# Altium footprint library LUMI_Standard_Auto_Soldering_LIB.PcbLib: 344 footprints (part 4 of 22)
Each footprint in its own frame and in the unit in brackets; x right, y up, seen from the top. Pads: shape width x height; smd on the part's side, far side on the other; paste and mask are expansions set on the pad; w line width, h text height; cw(c..) or ccw(c..) is an arc to the next point about the centre after c.
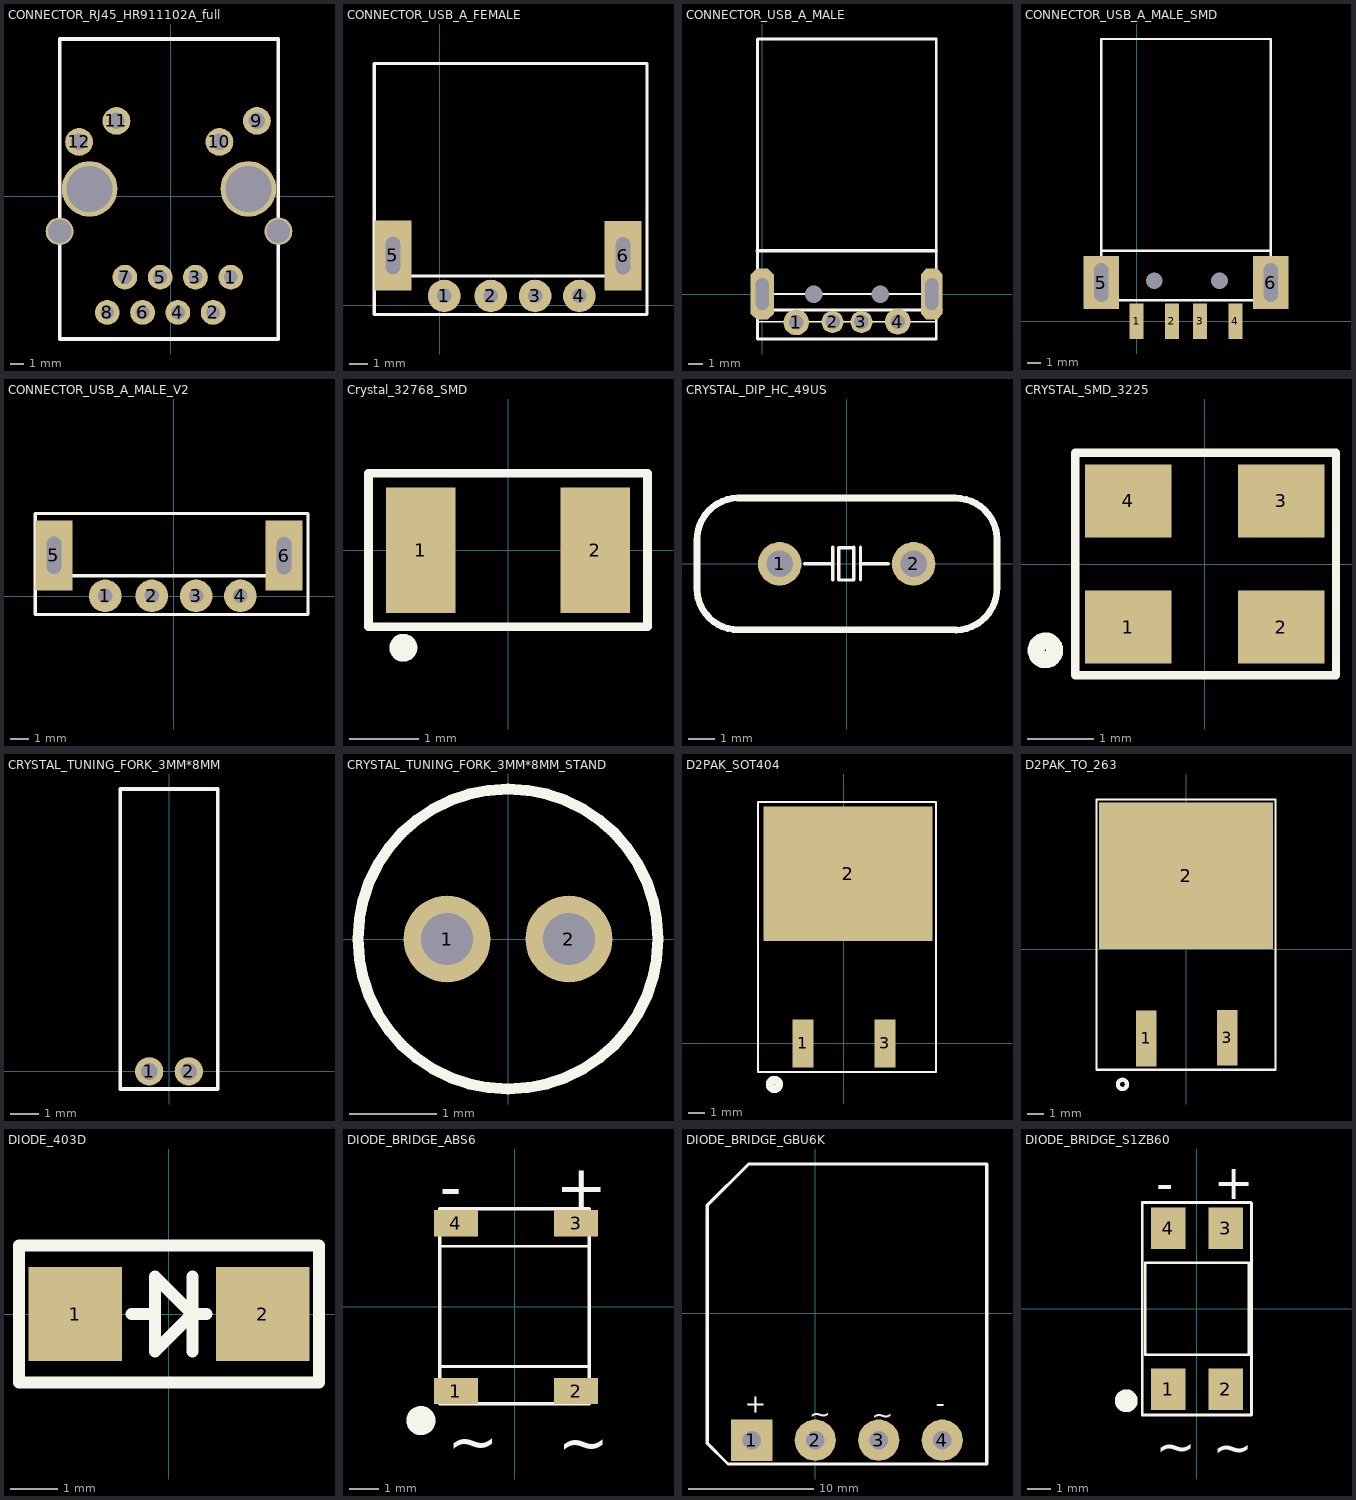
[diagram p3: the footprints below, top view; thin cyan lines are the x and y axes]

## CONNECTOR_RJ45_HR911102A_full [mm] "Single Port RJ45 Connector with Integrated Magnetics and LED"
pads (16):
  round 1.778 hole 1: 1(4.317,-5.837) 2(3.047,-8.377) 3(1.777,-5.837) 4(0.507,-8.377) 5(-0.763,-5.837) 6(-2.033,-8.377) 7(-3.303,-5.837) 8(-4.573,-8.377)
  round 2 hole 1.2: 9(6.197,5.413) 10(3.5,3.9) 11(-3.913,5.413) 12(-6.6,3.9)
  round 2 hole 1.7: ""(-8.003,-2.537) ""(7.747,-2.537)
  round 4 hole 3.3: ""(-5.843,0.513) ""(5.587,0.513)
Top Overlay:
  lines w0.254: -8.003,-10.287 7.747,-10.287 7.747,11.303 -8.003,11.303 -8.003,-10.287
3D body: height 13.42, standoff -3.38, extent -8.3,-10 7.7,11.3

## CONNECTOR_USB_A_FEMALE [mil] "USB A connector, 4pin, For USB sing"
height 100
pads (6):
  round 70 hole 31: 1(10,20) 2(110,20) 3(205,20) 4(300,20)
  rect 80x150 hole 31 slot 80 at 90 deg: 5(-100,107) 6(393.7,106.3)
Top Overlay:
  lines w7: -103,63 396,63 ; -140,-20 445,-20 445,519 -140,519 -140,-20
3D body: height 273.62, standoff -165.35, extent -163.02,-19 459.02,520.37

## CONNECTOR_USB_A_MALE [mm] "USB A connector, 4pin, For USB sing"
height 2.54
pads (8):
  round 1.778 hole 1: 1(2.35,-1.95) 4(9.35,-1.9)
  round 1.524 hole 1: 2(4.85,-1.925) 3(6.85,-1.925)
  oct 1.6x3.5 hole 0.9 slot 2.2 at 90 deg: ""(0,0)
  round 0 hole 1.2: ""(3.55,0) ""(8.15,0)
  oct 1.5x3.5 hole 0.9 slot 2.2 at 90 deg: ""(11.7,0)
Top Overlay:
  lines w0.1: -0.325,-1.9 12,-1.9
  lines w0.127: 0,0 11.7,0
  lines w0.178: -0.316,-1.1 12.358,-1.1 ; -0.325,-3.1 -0.325,17.6 12,17.6 12,-3.1 -0.325,-3.1
  lines w0.254: -0.325,3 12,3
3D body: height 3.52, standoff -2.18, extent -0.4,-2.3 12.1,17.73

## CONNECTOR_USB_A_MALE_SMD [mil] "For USB SMD"
height 150
pads (8):
  rect 40x100 smd: 1(0,0) 2(100,0) 3(180,0) 4(280,0)
  round 0 hole 47.24: 2(50,115) 2(235,115)
  rect 100x150 hole 40 slot 110 at 90 deg: 5(-100,110) 6(380,110)
Top Overlay:
  lines w7: -100,200 380,200 ; -100,60 380,60 380,800 -100,800 -100,60
3D body: height 85.83, standoff -138.58, extent -105.32,-5.91 386.81,809.05

## CONNECTOR_USB_A_MALE_V2 [mil]
pads (6):
  round 70 hole 31: 1(-147.48,0.32) 2(-47.48,0.32) 3(47.52,0.32) 4(142.52,0.32)
  rect 80x150 hole 31 slot 80 at 90 deg: 5(-257.48,87.31) 6(236.22,86.61)
Top Overlay:
  lines w7: -260.48,43.31 238.52,43.31 ; -297.48,-39.69 287.52,-39.69 287.52,177.17 -297.48,177.17 -297.48,-39.69
3D body: height 273.62, standoff -165.35, extent -320.5,-38.69 301.54,500.68

## Crystal_32768_SMD [mm]
pads (2):
  rect 1x1.8 smd: 1(-1.25,0) 2(1.25,0)
Top Overlay:
  circle w0.2: c-1.5,-1.4 r0.1
  lines w0.127: -2,-1.1 2,-1.1 2,1.1 -2,1.1 -2,-1.1
3D body: height 0.8, standoff 0, extent -1.6,-0.75 1.6,0.75

## CRYSTAL_DIP_HC_49US [mil]
pads (2):
  round 65 hole 40: 1(-100,0) 2(100,0)
Top Overlay:
  lines w5: -223.43,-37.4 -222.44,-37.4 ; -62.99,0 -21.65,0 ; -20.67,-23.62 -20.67,24.61 ; 10.33,-24.11 -11.81,-24.11 -11.81,24.11 10.33,24.11 ; 10.83,-23.62 10.83,24.61 ; 20.67,-23.62 20.67,24.61 ; 20.67,0 62.01,0 ; 223.43,36.91 224.41,36.91
  lines w10: 162.4,97.93 cw(c162.89,36.42) 224.41,36.91 224.41,-34.94 cw(c161.91,-36.42) 163.39,-98.92 ; 162.4,98.43 -162.4,98.43 ccw(c-160.93,35.93) -223.43,34.45 -223.43,-37.4 ccw(c-161.91,-36.91) -161.42,-98.43 163.39,-98.43
3D body: height 145.67, standoff -149.61, extent -223.43,-93.07 223.43,90

## CRYSTAL_SMD_3225 [mm]
pads (4):
  rect 1.3x1.1 smd: 1(-1.15,-0.95) 2(1.15,-0.95) 3(1.15,0.95) 4(-1.15,0.95)
Top Overlay:
  circle w0.254: c-2.4,-1.3 r0.141
  lines w0.127: -1.95,-1.675 -1.95,1.4 -1.95,1.675 1.575,1.675 1.975,1.675 1.975,-1.675 -1.95,-1.675
3D body: height 0.81, standoff 0, extent -1.6,-1.25 1.6,1.25

## CRYSTAL_TUNING_FORK_3MM*8MM [mm]
pads (2):
  round 1 hole 0.6 mask+0.07: 1(-0.7,0) 2(0.7,0)
Top Overlay:
  lines w0.127: -1.725,-0.625 -1.725,10 1.725,10 1.725,-0.625 -1.725,-0.625
3D body: height 3.1, standoff -0.1, extent -1.725,-0.812 1.725,9.963

## CRYSTAL_TUNING_FORK_3MM*8MM_STAND [mm]
pads (2):
  round 1 hole 0.6 mask+0.07: 1(-0.7,0) 2(0.7,0)
Top Overlay:
  circle w0.127: c0,0 r1.725
3D body: height 8.27, standoff -2.5, extent -1.725,-1.6 1.725,1.6

## D2PAK_SOT404 [mm]
pads (3):
  rect 1.3x3 smd: 1(-2.54,0) 3(2.54,0)
  rect 10.5x8.35 smd: 2(0.254,10.541)
Top Overlay:
  circle w0.5: c-4.318,-2.54 r0.284
  lines w0.127: -5.334,-1.778 0,-1.778 5.715,-1.778 5.715,14.986 -5.334,14.986 -5.334,-1.778
3D body: height 4.83, standoff 0, extent -5.16,-1.144 5.51,14.736

## D2PAK_TO_263 [mm]
pads (3):
  rect 1.26x3.43 smd: 1(-2.45,-5.475) 3(2.54,-5.44)
  rect 10.67x9 smd: 2(0,4.5)
Top Overlay:
  circle w0.254: c-3.9,-8.3 r0.283
  lines w0.127: -5.5,-7.4 -5.5,9.2 4.7,9.2 5.5,9.2 5.5,-7.4 5.3,-7.4 -5.2,-7.4 -5.5,-7.4
3D body: height 5.03, standoff 0.02, extent -5.08,-7.133 5.08,8.131

## DIODE_403D [mm]
pads (2):
  rect 2x2 smd: 1(-2,0) 2(2,0)
Top Overlay:
  lines w0.254: -0.8,0 -0.3,0 ; 0.5,-0.8 0.5,0.8 ; 0.8,0 0.5,0 ; 0.5,0 -0.3,0.8 -0.3,-0.8 0.5,0 ; -3.2,-1.46 -3.2,1.46 3.2,1.46 3.2,-1.46 -3.2,-1.46
3D body: height 2.3, standoff 0, extent 0.6,-1.5 0.8,1.4
3D body: height 1.1, standoff 0, extent 2.3,-0.75 2.6,0.75
3D body: height 1.1, standoff 0, extent -2.6,-0.8 -2.3,0.7
3D body: height 2.2, standoff 0, extent -2.3,-1.5 2.3,1.5

## DIODE_BRIDGE_ABS6 [mm]
pads (4):
  rect 1.5x0.9 smd: 1(-2.012,-2.865) 2(2.088,-2.865) 3(2.088,2.855) 4(-2.012,2.855)
Top Overlay:
  circle w0.5: c-3.202,-3.873 r0.247
  lines w0.1: -2.56,-2.032 -2.56,2.068 2.54,2.068 2.54,-2.032 -2.56,-2.032
  lines w0.127: -2.56,-3.302 2.54,-3.302 2.54,3.348 -2.56,3.348 -2.56,-3.302
  text "~" at 1.462,-5.353 h1.52
  text "~" at -2.308,-5.328 h1.52
  text "+" at 1.397,3.348 h1.52
  text "-" at -2.56,3.348 h1.52
3D body: height 1.5, standoff 0.2, extent -2.56,-2.032 2.54,2.068

## DIODE_BRIDGE_GBU6K [mil]
pads (4):
  rect 130x130 hole 59.06: 1(-200,-400)
  round 130 hole 59.06: 2(0,-400) 3(200,-400) 4(400,-400)
Top Overlay:
  lines w10: -340,-410 -340,340 -210,470 540,470 540,-475 -275,-475 -340,-410
  text "+" at -221.46,-312.99 h60
  text "~" at -19.68,-346.46 h60
  text "~" at 178.15,-350.39 h60
  text "-" at 378.94,-312.01 h60
3D body: height 150, standoff -485.83, extent -338.98,-410 538.98,467.95

## DIODE_BRIDGE_S1ZB60 [mm]
pads (4):
  rect 1.5x1.8 smd: 1(-1.25,-3.5) 2(1.25,-3.5) 3(1.25,3.5) 4(-1.25,3.5)
Top Overlay:
  circle w0.5: c-3.075,-4 r0.247
  lines w0.1: -2.25,-2 -2.25,2 2.25,2 2.25,-2 -2.25,-2
  lines w0.127: -2.375,-4.625 -2.375,4.625 -2.25,4.625 2.35,4.625 2.375,4.6 2.375,-4.625 -2.375,-4.625
  text "-" at -1.775,4.725 h1.52
  text "+" at 0.725,4.775 h1.52
  text "~" at -1.8,-6.725 h1.52
  text "~" at 0.7,-6.75 h1.52
3D body: height 1.5, standoff 0.2, extent -2.25,-2 2.25,2